# Altium footprint library 我的元件库02.PcbLib: 300 footprints (part 12 of 19)
Each footprint in its own frame and in the unit in brackets; x right, y up, seen from the top. Pads: shape width x height; smd on the part's side, far side on the other; paste and mask are expansions set on the pad; w line width, h text height; cw(c..) or ccw(c..) is an arc to the next point about the centre after c.
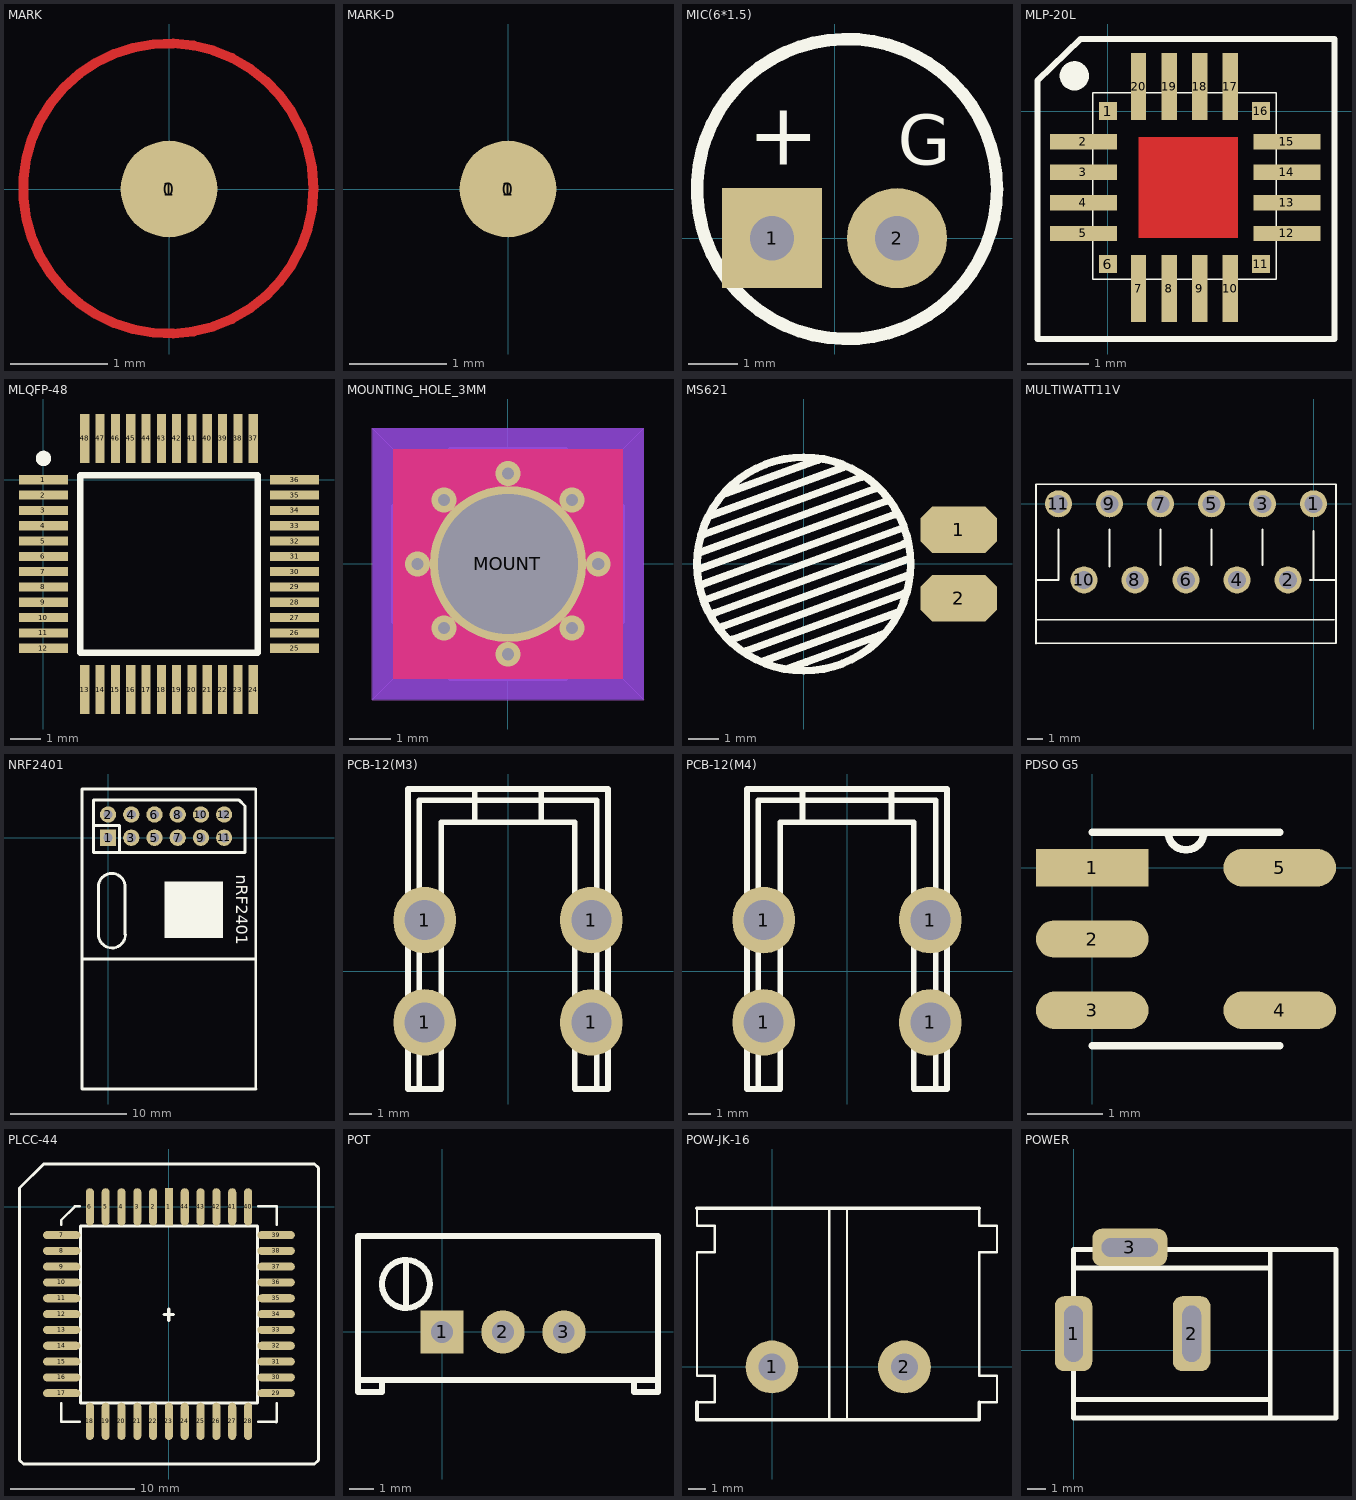
[diagram p11: the footprints below, top view; thin cyan lines are the x and y axes]

## MARK [mm]
pads (2):
  round 3.1 on Top Solder: 0(0,0)
  round 1 smd: 1(0,0)
Top Layer:
  circle w0.1: c-0.007,0.005 r1.5

## MARK-D [mm]
pads (3):
  round 3.1 on Top Solder: 0(0,0)
  round 3.1 on Bottom Solder: 1(0,0)
  round 1 all layers, no hole: 1(0,0)
Multi-Layer:
  circle w0.1: c-0.007,0.005 r1.5

## MIC(6*1.5) [mil]
pads (2):
  rect 80x80 hole 35.43: 1(-50,0)
  round 80 hole 35.43: 2(50,0)
Top Overlay:
  circle w10: c10,39.37 r120
  text "+" at -69.54,58.89 h50
  text "G" at 50.46,58.89 h40

## MLP-20L [mm]
pads (20):
  rect 0.3x0.3 smd: 1(0,0) 6(0,-2.5) 11(2.5,-2.5) 16(2.5,0)
  rect 1.1x0.25 smd: 2(-0.4,-0.5) 3(-0.4,-1) 4(-0.4,-1.5) 5(-0.4,-2) 12(2.925,-2) 13(2.925,-1.5) 14(2.925,-1) 15(2.925,-0.5)
  rect 0.25x1.1 smd: 7(0.5,-2.9) 8(1,-2.9) 9(1.5,-2.9) 10(2,-2.9) 17(2,0.4) 18(1.5,0.4) 19(1,0.4) 20(0.5,0.4)
Top Layer:
  region: 0.499,-0.425 0.499,-2.075 2.125,-2.075 2.125,-0.425
Top Overlay:
  circle w0.254: c-0.55,0.575 r0.112
  lines w0.025: -0.25,-2.75 2.75,-2.75 2.75,0.3 -0.25,0.3 -0.25,-2.75
  lines w0.1: -1.15,-3.725 -1.15,0.5 -0.45,1.175 ; -1.141,-3.721 3.7,-3.725 3.7,1.175 -0.434,1.177

## MLQFP-48 [mm]
pads (48):
  rect 1.6x0.3 smd: 1(0,0) 2(0,-0.5) 3(0,-1) 4(0,-1.5) 5(0,-2) 6(0,-2.5) 7(0,-3) 8(0,-3.5) 9(0,-4) 10(0,-4.5) 11(0,-5) 12(0,-5.5) 25(8.2,-5.5) 26(8.2,-5) 27(8.2,-4.5) 28(8.2,-4) 29(8.2,-3.5) 30(8.2,-3) 31(8.2,-2.5) 32(8.2,-2) 33(8.2,-1.5) 34(8.2,-1) 35(8.2,-0.5) 36(8.2,0)
  rect 0.3x1.6 smd: 13(1.35,-6.85) 14(1.85,-6.85) 15(2.35,-6.85) 16(2.85,-6.85) 17(3.35,-6.85) 18(3.85,-6.85) 19(4.35,-6.85) 20(4.85,-6.85) 21(5.35,-6.85) 22(5.85,-6.85) 23(6.35,-6.85) 24(6.85,-6.85) 37(6.85,1.35) 38(6.35,1.35) 39(5.85,1.35) 40(5.35,1.35) 41(4.85,1.35) 42(4.35,1.35) 43(3.85,1.35) 44(3.35,1.35) 45(2.85,1.35) 46(2.35,1.35) 47(1.85,1.35) 48(1.35,1.35)
Top Overlay:
  circle w0.25: c0,0.7 r0.125
  lines w0.2: 1.2,-5.65 1.2,0.15 7,0.15 7,-5.65 1.2,-5.65

## MOUNTING_HOLE_3MM [mm] "Non-plated mounting hole for 3mm screw"
height 3.5
pads (1):
  round 3.8 hole 3.4: MOUNT(0,0)
via 0,2.2 diameter 0.6 hole 0.3
via -1.556,1.556 diameter 0.6 hole 0.3
via -2.2,0 diameter 0.6 hole 0.3
via -1.556,-1.556 diameter 0.6 hole 0.3
via 0,-2.2 diameter 0.6 hole 0.3
via 1.556,-1.556 diameter 0.6 hole 0.3
via 2.2,0 diameter 0.6 hole 0.3
via 1.556,1.556 diameter 0.6 hole 0.3
Top Layer:
  circle w1: c0,0 r2.3
  rectangle: -2.8,-2.8 2.8,2.8
Top Layer keep-out:
  rectangle: -3.3,-3.3 3.3,3.3
Bottom Layer:
  rectangle: -2.8,-2.8 2.8,2.8
Bottom Layer keep-out:
  rectangle: -3.3,-3.3 3.3,3.3
Top Solder:
  rectangle: -3.2,-3.2 3.2,3.2
Bottom Solder:
  rectangle: -3,-3 3,3
Keep-Out Layer:
  circle w1.2: c0,0 r2.5
Mechanical 2:
  lines w0.025: -3.3,-3.3 0,0 ; -3.3,-3.3 3.3,-3.3 ; -3.3,-3.3 -3.3,3.3 ; -3.3,3.3 3.3,3.3 ; -3.3,3.3 0,0 ; 0,0 3.3,-3.3 ; 0,0 3.3,3.3 ; 3.3,-3.3 3.3,3.3
Mechanical 7:
  circle w1.2: c0,0 r2.2
  circle w0.1: c0,0.002 r2.7
  region: 0.8,-0.5 0.5,-0.8 1.066,-1.366 1.366,-1.066
  rectangle: 0.5,-1.6 1.6,-0.8
  region: 0.8,-0.5 0.8,-1.6 1.6,-1.6 1.6,-0.5
  region: -0.5,-0.8 -0.8,-0.5 -1.366,-1.066 -1.066,-1.366
  region: -1.6,-0.5 -1.6,-1.6 -0.8,-1.6 -0.8,-0.5
  region: -0.5,-0.8 -1.6,-0.8 -1.6,-1.6 -0.5,-1.6
  region: -0.8,0.5 -0.5,0.8 -1.066,1.366 -1.366,1.066
  region: -0.5,1.6 -1.6,1.6 -1.6,0.8 -0.5,0.8
  region: -0.8,0.5 -0.8,1.6 -1.6,1.6 -1.6,0.5
  region: 0.5,0.8 0.8,0.5 1.366,1.066 1.066,1.366
  region: 1.6,0.5 1.6,1.6 0.8,1.6 0.8,0.5
  rectangle: 0.5,0.8 1.6,1.6
Mechanical 8:
  circle w0.6: c0,0 r2
  rectangle: -2.8,-1.4 -1.7,1.4
  region: 1.4,1.699 1.4,2.799 -1.4,2.799 -1.4,1.699
  region: -1.401,-1.7 -1.401,-2.8 1.399,-2.8 1.399,-1.7
  region: 0.551,-1.951 1.4,-2.8 2.8,-1.4 1.951,-0.551
  region: 1.951,0.551 2.8,1.4 1.4,2.8 0.551,1.951
  region: -0.551,1.951 -1.4,2.8 -2.8,1.4 -1.951,0.551
  region: -1.951,-0.551 -2.8,-1.4 -1.4,-2.8 -0.551,-1.951
  rectangle: 1.7,-1.401 2.8,1.399
  lines w0.1: -2.8,-1.4 -2.8,1.4 -1.4,2.8 1.4,2.8 2.8,1.4 2.8,-1.4 1.4,-2.8 -1.4,-2.8 -2.8,-1.4

## MS621 [mm]
pads (2):
  oct 2.5x1.524 smd: 1(5.082,1.11) 2(5.082,-1.122)
Top Overlay:
  circle w0.254: c0.002,-0.006 r3.5
  lines w0.254: -3.398,-0.162 2.706,2.06 ; -3.384,0.384 2.345,2.469 ; -3.318,-0.673 2.974,1.617 ; -3.287,-1.203 3.244,1.174 ; -3.281,0.962 1.895,2.846 ; -3.028,1.595 1.294,3.168 ; -2.926,-1.612 3.276,0.646 ; -2.658,-2.055 3.356,0.134 ; -2.544,2.311 0.463,3.406 ; -2.341,-2.48 3.387,-0.395 ; -1.888,-2.856 3.281,-0.975 ; -1.291,-3.179 3.032,-1.606 ; -0.482,-3.425 2.57,-2.314 ; 0.089,-3.217 2.476,-2.349

## MULTIWATT11V [mm]
pads (11):
  round 1.8 hole 1.2: 1(0,0) 2(-1.7,-5.08) 3(-3.4,0) 4(-5.1,-5.08) 5(-6.8,0) 6(-8.5,-5.08) 7(-10.2,0) 8(-11.9,-5.08) 9(-13.6,0) 10(-15.3,-5.08) 11(-17,0)
Top Overlay:
  lines w0.127: -18.432,-7.732 -17,-7.732 1.368,-7.732 ; -17,-1.7 -17,-5.08 -18.48,-5.08 -18.5,-5.1 ; -13.6,-4.2 -13.6,-1.7 ; -13.6,-0.86 -13.6,0 ; -10.2,-4.1 -10.2,-1.7 ; -10.2,-0.704 -10.2,0 ; -6.8,-4.1 -6.8,-1.7 ; -6.8,-0.468 -6.8,0 ; -3.4,-4.1 -3.4,-1.7 ; -3.4,-0.392 -3.4,0 ; -0.22,-5.08 1.48,-5.08 1.5,-5.1 ; 0,-5.08 0,-1.8 ; 0,-0.272 0,0 ; -18.5,-5.1 -18.5,-9.332 -18.468,-9.3 1.5,-9.3 1.5,-5.1 ; -18.5,-5.1 -18.5,1.3 1.5,1.3 1.5,-5.1
3D body: height 20.5, standoff -4.42, extent -18.461,-8.966 1.139,0.102

## NRF2401 [mm]
pads (12):
  rect 1.4x1.4 hole 0.8: 1(0,0)
  round 1.4 hole 0.8: 2(0,2) 3(2,0) 4(2,2) 5(4,0) 6(4,2) 7(6,0) 8(6,2) 9(8,0) 10(8,2) 11(10,0) 12(10,2)
Top Overlay:
  rectangle: 4.85,-8.625 9.9,-3.75
  lines w0.254: -2.25,-10.45 12.675,-10.45 12.725,-10.4 ; -1.27,1.045 0.995,1.045 0.995,-1.27 ; -0.843,-4.235 cw(c0.316,-4.239) 1.475,-4.25 1.475,-8.35 ; -0.825,-4.225 -0.825,-8.325 ccw(c0.334,-8.336) 1.493,-8.34 ; 11.25,3.27 11.255,3.27 ; 12.75,-21.65 12.725,-21.65 ; 11.255,3.27 11.8,2.725 11.8,-1.27 -1.27,-1.27 -1.27,3.27 11.255,3.27 ; 12.725,-21.65 -2.25,-21.65 -2.25,4.2 12.7,4.2 12.725,4.175 12.725,-21.65
  text "nRF2401" at 11.05,-3.175 h1.02

## PCB-12(M3) [mm]
pads (4):
  oval 2.8x3 hole 1.8: 1(-3.75,-2.3) 1(-3.75,2.3) 1(3.75,-2.3) 1(3.75,2.3)
Top Overlay:
  lines w0.254: -4,-5.3 -4,7.7 4,7.7 4,-5.3 ; -1.5,6.7 -1.5,8.2 ; 1.5,6.7 1.5,8.2 ; -4.5,-5.3 -3,-5.3 -3,6.7 3,6.7 3,-5.3 4.5,-5.3 4.5,8.2 -4.5,8.2 -4.5,-5.3
3D body: height 8, standoff -5, extent -4.125,-3.48 4.125,7.82

## PCB-12(M4) [mm]
pads (4):
  oval 2.8x3 hole 1.8: 1(-3.75,-2.3) 1(-3.75,2.3) 1(3.75,-2.3) 1(3.75,2.3)
Top Overlay:
  lines w0.254: -4,-5.3 -4,7.7 4,7.7 4,-5.3 ; -2,6.7 -2,8.2 ; 2,6.7 2,8.2 ; -4.5,-5.3 -3,-5.3 -3,6.7 3,6.7 3,-5.3 4.5,-5.3 4.5,8.2 -4.5,8.2 -4.5,-5.3
3D body: height 8, standoff -5, extent -4.1,-3.48 4.15,7.82

## PDSO G5 [mm]
pads (5):
  rect 1.5x0.5 smd: 1(0,0)
  oval 1.5x0.5 smd: 2(0,-0.95) 3(0,-1.9) 4(2.5,-1.9) 5(2.5,0)
Top Overlay:
  lines w0.1: 0,-2.375 2.5,-2.375 ; 0,0.475 1.485,0.475 ; 1.012,0.475 ccw(c1.25,0.475) 1.488,0.475 ; 1.015,0.475 2.5,0.475

## PLCC-44 [mm]
pads (44):
  rect 0.65x3 smd: 1(0,0)
  oval 0.65x3 smd: 2(-1.27,0) 3(-2.54,0) 4(-3.81,0) 5(-5.08,0) 6(-6.35,0) 18(-6.35,-17.216) 19(-5.08,-17.216) 20(-3.81,-17.216) 21(-2.54,-17.216) 22(-1.27,-17.216) 23(0,-17.216) 24(1.27,-17.216) 25(2.54,-17.216) 26(3.81,-17.216) 27(5.08,-17.216) 28(6.35,-17.216) 40(6.35,0) 41(5.08,0) 42(3.81,0) 43(2.54,0) 44(1.27,0)
  oval 3x0.65 smd: 7(-8.608,-2.258) 8(-8.608,-3.528) 9(-8.608,-4.798) 10(-8.608,-6.068) 11(-8.608,-7.338) 12(-8.608,-8.608) 13(-8.608,-9.878) 14(-8.608,-11.148) 15(-8.608,-12.418) 16(-8.608,-13.688) 17(-8.608,-14.958) 29(8.608,-14.958) 30(8.608,-13.688) 31(8.608,-12.418) 32(8.608,-11.148) 33(8.608,-9.878) 34(8.608,-8.608) 35(8.608,-7.338) 36(8.608,-6.068) 37(8.608,-4.798) 38(8.608,-3.528) 39(8.608,-2.258)
Top Overlay:
  lines w0.2: -8.65,-15.783 -8.65,-17.258 -7.175,-17.258 ; -8.65,-1.433 -8.65,-1.058 -7.55,0.042 -7.175,0.042 ; 7.175,-17.258 8.65,-17.258 8.65,-15.783 ; 7.175,0.042 8.65,0.042 8.65,-1.433
  lines w0.254: -0.375,-8.646 0.353,-8.646 ; -0.019,-9.121 -0.019,-8.206 ; 8.609,-17.258 8.65,-17.258 ; -11.995,-20.328 -11.995,0.5 -11.995,1.516 -10.066,3.445 11.689,3.445 12.005,3.129 12.005,-20.328 11.689,-20.644 -11.679,-20.644 -11.995,-20.328 ; -7.112,-15.752 7.112,-15.752 7.112,-1.528 -7.112,-1.528 -7.112,-15.752
3D body: height 4.39, standoff 0, extent -8.788,-17.423 8.737,0.102

## POT [mm]
pads (3):
  rect 1.8x1.8 hole 0.9: 1(0,0)
  round 1.8 hole 0.9: 2(2.54,0) 3(5.08,0)
Top Overlay:
  circle w0.254: c-1.5,2 r1
  lines w0.254: -2.5,-2 -2.5,-2.5 -3.5,-2.5 -3.5,-2 ; -1.5,1 -1.5,3 ; 8,-2 8,-2.5 9,-2.5 9,-2 ; -3.5,-2 9,-2 ; -3.5,-2 -3.5,4 9,4 9,-2
3D body: height 12.46, standoff -5.04, extent -2.06,-2.438 7.14,2.362

## POW-JK-16 [mm]
pads (2):
  round 3 hole 1.524: 1(0,0) 2(7.5,0)
Top Overlay:
  lines w0.127: -4.25,-2 -3.25,-2 -3.25,-0.5 -4.25,-0.5 -4.25,6.5 -3.25,6.5 -3.25,8 -4.25,8 -4.25,9 ; 3.25,-3 3.25,9 ; 4.25,-3 4.25,9 ; 11.75,-2 12.75,-2 12.75,-0.5 11.75,-0.5 11.75,6.5 12.75,6.5 12.75,8 11.75,8 11.75,9
  lines w0.2: -4.25,-2 -4.25,-3 11.75,-3 11.75,-2 ; -4.25,9 11.75,9

## POWER [mm]
pads (3):
  rrect50% 2x4 hole 1 slot 3 at 90 deg: 1(0,0.889) 2(6.3,0.889)
  rrect50% 4x2 hole 1 slot 3 at 0 deg: 3(3,5.489)
Top Overlay:
  lines w0.254: 0,-2.616 10.49,-2.616 ; 0,4.394 10.49,4.394 ; 10.49,-3.607 10.49,5.385 ; 0,-3.607 0,5.385 13.995,5.385 13.995,-3.607 0,-3.607
3D body: height 11.02, standoff -3.48, extent -0.043,-3.614 13.783,5.892